# Altium footprint library SparkFun-Connectors.PCBLIB: 409 footprints (part 9 of 26)
Each footprint in its own frame and in the unit in brackets; x right, y up, seen from the top. Pads: shape width x height; smd on the part's side, far side on the other; paste and mask are expansions set on the pad; w line width, h text height; cw(c..) or ccw(c..) is an arc to the next point about the centre after c.
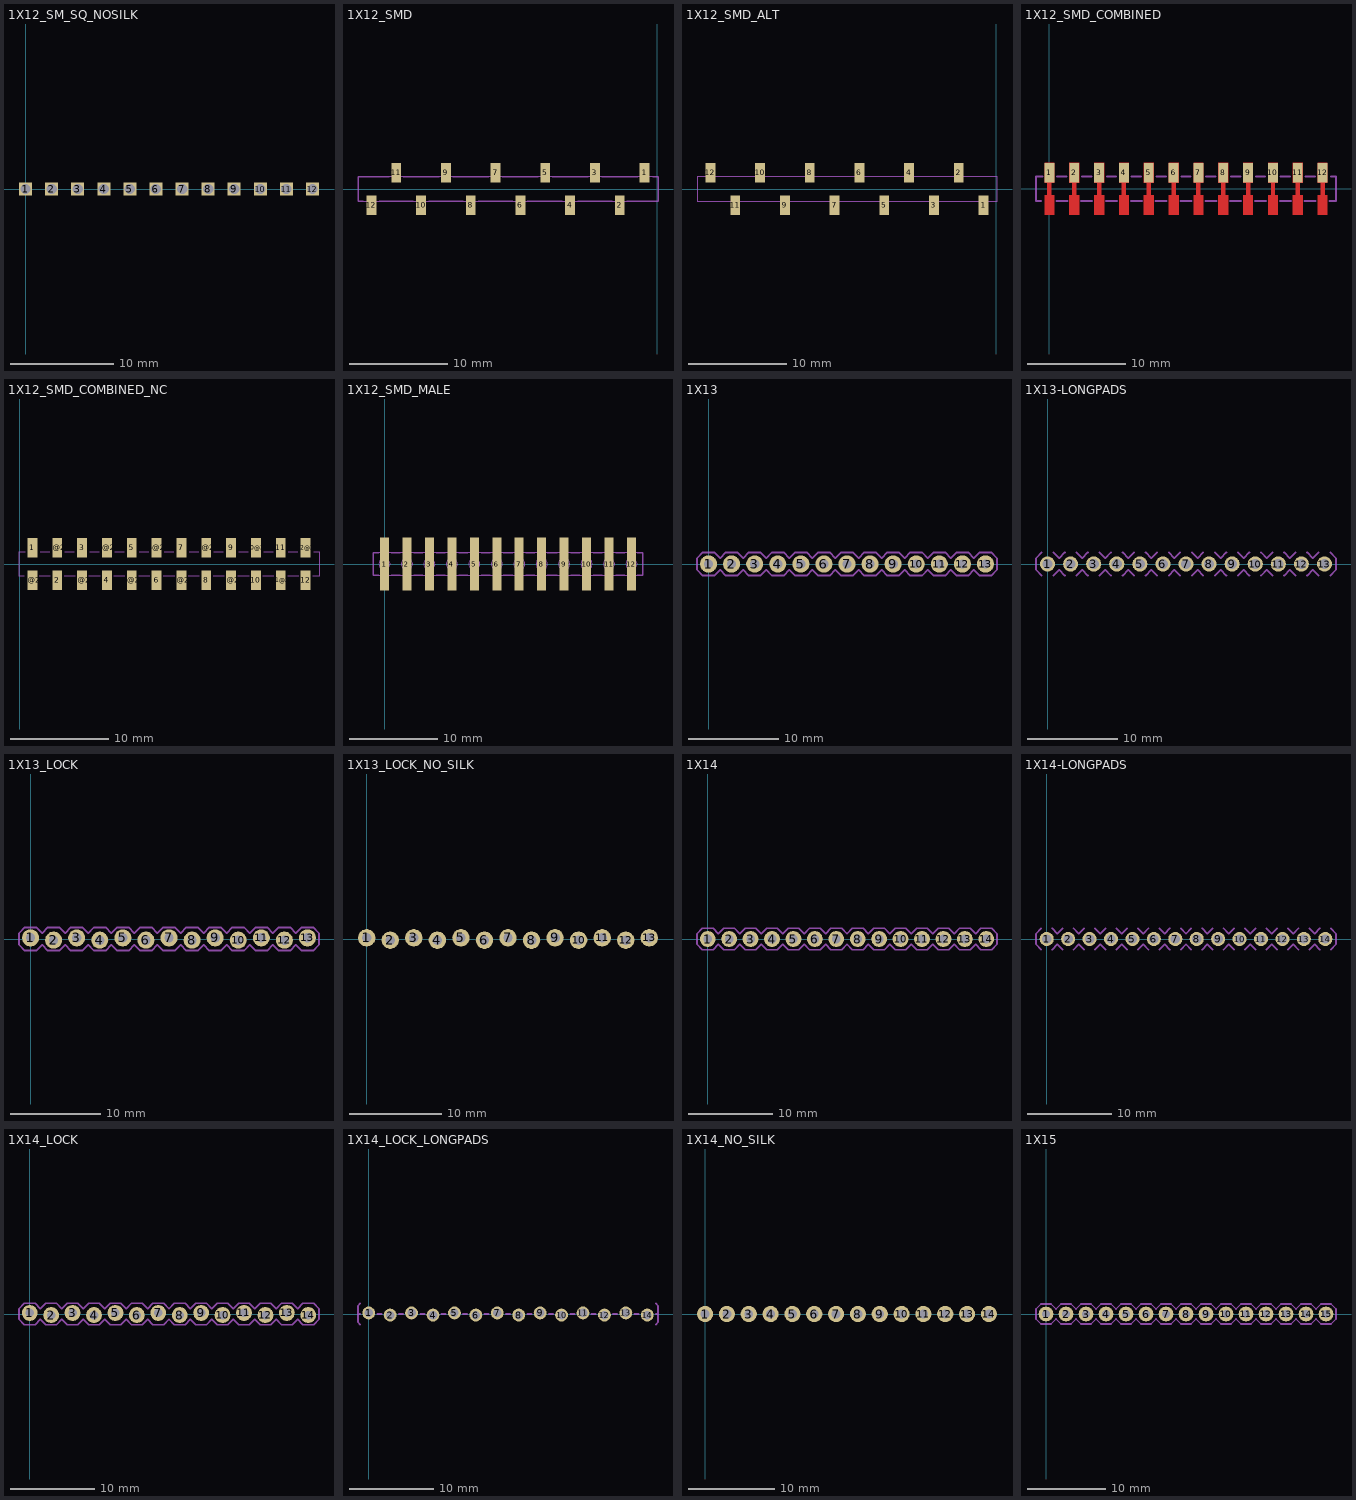
[diagram p8: the footprints below, top view; thin cyan lines are the x and y axes]

## 1X12_SM_SQ_NOSILK [mil]
pads (12):
  rect 50x50 / inner round 46.19 / far side rect 50x50 hole 40: 1(0,0) 2(100,0) 3(200,0) 4(300,0) 5(400,0) 6(500,0) 7(600,0) 8(700,0) 9(800,0) 10(900,0) 11(1000,0) 12(1100,0)

## 1X12_SMD [mm]
pads (12):
  rect 1x2 smd: 1(-1.27,1.65) 2(-3.81,-1.65) 3(-6.35,1.65) 4(-8.89,-1.65) 5(-11.43,1.65) 6(-13.97,-1.65) 7(-16.51,1.65) 8(-19.05,-1.65) 9(-21.59,1.65) 10(-24.13,-1.65) 11(-26.67,1.65) 12(-29.21,-1.65)
tDocu:
  lines w0.127: -20.42,-1.25 0.1,-1.25 0.1,1.25 -20.42,1.25 ; -10.06,-1.25 -30.58,-1.25 -30.58,1.25 -10.06,1.25
tPlace:
  lines w0.127: -30.06,-1.25 -30.58,-1.25 -30.58,1.25 -27.393,1.25 ; -28.421,-1.25 -24.919,-1.25 ; -25.967,1.25 -22.293,1.25 ; -23.341,-1.25 -19.839,-1.25 ; -20.887,1.25 -17.213,1.25 ; -18.261,-1.25 -14.759,-1.25 ; -15.807,1.25 -12.133,1.25 ; -13.247,-1.25 -10.06,-1.25 ; -13.181,-1.25 -9.679,-1.25 ; -10.727,1.25 -7.053,1.25 ; -10.58,1.25 -10.06,1.25 ; -8.101,-1.25 -4.599,-1.25 ; -5.647,1.25 -1.973,1.25 ; -3.087,-1.25 0.1,-1.25 0.1,1.25 -0.42,1.25

## 1X12_SMD_ALT [mm]
pads (12):
  rect 1x2 smd: 1(-1.27,-1.65) 2(-3.81,1.65) 3(-6.35,-1.65) 4(-8.89,1.65) 5(-11.43,-1.65) 6(-13.97,1.65) 7(-16.51,-1.65) 8(-19.05,1.65) 9(-21.59,-1.65) 10(-24.13,1.65) 11(-26.67,-1.65) 12(-29.21,1.65)
tDocu:
  lines w0.127: -20.42,-1.25 0.1,-1.25 0.1,1.25 -20.42,1.25 ; -10.06,-1.25 -30.58,-1.25 -30.58,1.25 -10.06,1.25
tPlace:
  lines w0.127: -30.06,1.25 -30.58,1.25 -30.58,-1.25 -27.393,-1.25 ; -28.507,1.25 -24.833,1.25 ; -25.881,-1.25 -22.379,-1.25 ; -23.427,1.25 -19.753,1.25 ; -20.801,-1.25 -17.299,-1.25 ; -18.347,1.25 -14.673,1.25 ; -15.721,-1.25 -12.219,-1.25 ; -13.267,1.25 -9.593,1.25 ; -13.247,1.25 -10.06,1.25 ; -10.641,-1.25 -7.139,-1.25 ; -10.58,-1.25 -10.06,-1.25 ; -8.187,1.25 -4.513,1.25 ; -5.561,-1.25 -2.059,-1.25 ; -3.087,1.25 0.1,1.25 0.1,-1.25 -0.42,-1.25

## 1X12_SMD_COMBINED [mm]
pads (12):
  rect 1x2 smd mask+0: 1(0,1.65) 2(2.54,1.65)
  rect 1x2 smd paste+0 mask+0: 3(5.08,1.65) 4(7.62,1.652) 5(10.16,1.65) 6(12.7,1.652) 7(15.24,1.65) 8(17.78,1.652) 9(20.32,1.65) 10(22.86,1.652) 11(25.4,1.65) 12(27.94,1.652)
Top:
  region: 2.04,2.65 3.04,2.65 3.04,0.65 2.74,0.65 2.74,-0.65 3.04,-0.65 3.04,-2.65 2.04,-2.65 2.04,-0.65 2.34,-0.65 2.34,0.65 2.04,0.65
  region: -0.5,2.65 0.5,2.65 0.5,0.65 0.2,0.65 0.2,-0.65 0.5,-0.65 0.5,-2.65 -0.5,-2.65 -0.5,-0.65 -0.2,-0.65 -0.2,0.65 -0.5,0.65
  region: 4.59,2.65 5.59,2.65 5.59,0.65 5.29,0.65 5.29,-0.65 5.59,-0.65 5.59,-2.65 4.59,-2.65 4.59,-0.65 4.89,-0.65 4.89,0.65 4.59,0.65
  region: 7.12,2.65 8.12,2.65 8.12,0.65 7.82,0.65 7.82,-0.65 8.12,-0.65 8.12,-2.65 7.12,-2.65 7.12,-0.65 7.42,-0.65 7.42,0.65 7.12,0.65
  region: 9.66,2.65 10.66,2.65 10.66,0.65 10.36,0.65 10.36,-0.65 10.66,-0.65 10.66,-2.65 9.66,-2.65 9.66,-0.65 9.96,-0.65 9.96,0.65 9.66,0.65
  region: 12.21,2.65 13.21,2.65 13.21,0.65 12.91,0.65 12.91,-0.65 13.21,-0.65 13.21,-2.65 12.21,-2.65 12.21,-0.65 12.51,-0.65 12.51,0.65 12.21,0.65
  region: 17.28,2.65 18.28,2.65 18.28,0.65 17.98,0.65 17.98,-0.65 18.28,-0.65 18.28,-2.65 17.28,-2.65 17.28,-0.65 17.58,-0.65 17.58,0.65 17.28,0.65
  region: 14.74,2.65 15.74,2.65 15.74,0.65 15.44,0.65 15.44,-0.65 15.74,-0.65 15.74,-2.65 14.74,-2.65 14.74,-0.65 15.04,-0.65 15.04,0.65 14.74,0.65
  region: 19.82,2.65 20.82,2.65 20.82,0.65 20.52,0.65 20.52,-0.65 20.82,-0.65 20.82,-2.65 19.82,-2.65 19.82,-0.65 20.12,-0.65 20.12,0.65 19.82,0.65
  region: 22.37,2.65 23.37,2.65 23.37,0.65 23.07,0.65 23.07,-0.65 23.37,-0.65 23.37,-2.65 22.37,-2.65 22.37,-0.65 22.67,-0.65 22.67,0.65 22.37,0.65
  region: 27.44,2.65 28.44,2.65 28.44,0.65 28.14,0.65 28.14,-0.65 28.44,-0.65 28.44,-2.65 27.44,-2.65 27.44,-0.65 27.74,-0.65 27.74,0.65 27.44,0.65
  region: 24.9,2.65 25.9,2.65 25.9,0.65 25.6,0.65 25.6,-0.65 25.9,-0.65 25.9,-2.65 24.9,-2.65 24.9,-0.65 25.2,-0.65 25.2,0.65 24.9,0.65
Top Paste:
  region: 3.12,-0.56 3.12,-2.76 1.92,-2.76 1.92,-0.56
  region: 3.14,2.74 3.14,0.54 1.94,0.54 1.94,2.74
  region: 0.58,-0.56 0.58,-2.76 -0.62,-2.76 -0.62,-0.56
  region: 0.6,2.74 0.6,0.54 -0.6,0.54 -0.6,2.74
  region: 5.67,-0.56 5.67,-2.76 4.47,-2.76 4.47,-0.56
  region: 5.69,2.74 5.69,0.54 4.49,0.54 4.49,2.74
  region: 8.2,-0.56 8.2,-2.76 7,-2.76 7,-0.56
  region: 8.22,2.74 8.22,0.54 7.02,0.54 7.02,2.74
  region: 10.74,-0.56 10.74,-2.76 9.54,-2.76 9.54,-0.56
  region: 10.76,2.74 10.76,0.54 9.56,0.54 9.56,2.74
  region: 13.29,-0.56 13.29,-2.76 12.09,-2.76 12.09,-0.56
  region: 13.31,2.74 13.31,0.54 12.11,0.54 12.11,2.74
  region: 18.36,-0.56 18.36,-2.76 17.16,-2.76 17.16,-0.56
  region: 18.38,2.74 18.38,0.54 17.18,0.54 17.18,2.74
  region: 15.82,-0.56 15.82,-2.76 14.62,-2.76 14.62,-0.56
  region: 15.84,2.74 15.84,0.54 14.64,0.54 14.64,2.74
  region: 20.9,-0.56 20.9,-2.76 19.7,-2.76 19.7,-0.56
  region: 20.92,2.74 20.92,0.54 19.72,0.54 19.72,2.74
  region: 23.45,-0.56 23.45,-2.76 22.25,-2.76 22.25,-0.56
  region: 23.47,2.74 23.47,0.54 22.27,0.54 22.27,2.74
  region: 28.52,-0.56 28.52,-2.76 27.32,-2.76 27.32,-0.56
  region: 28.54,2.74 28.54,0.54 27.34,0.54 27.34,2.74
  region: 25.98,-0.56 25.98,-2.76 24.78,-2.76 24.78,-0.56
  region: 26,2.74 26,0.54 24.8,0.54 24.8,2.74
Top Solder:
  region: 3.12,-0.56 3.12,-2.76 1.92,-2.76 1.92,-0.56
  region: 3.14,2.74 3.14,0.54 1.94,0.54 1.94,2.74
  region: 0.58,-0.56 0.58,-2.76 -0.62,-2.76 -0.62,-0.56
  region: 0.6,2.74 0.6,0.54 -0.6,0.54 -0.6,2.74
  region: 5.67,-0.56 5.67,-2.76 4.47,-2.76 4.47,-0.56
  region: 5.69,2.74 5.69,0.54 4.49,0.54 4.49,2.74
  region: 8.2,-0.56 8.2,-2.76 7,-2.76 7,-0.56
  region: 8.22,2.74 8.22,0.54 7.02,0.54 7.02,2.74
  region: 10.74,-0.56 10.74,-2.76 9.54,-2.76 9.54,-0.56
  region: 10.76,2.74 10.76,0.54 9.56,0.54 9.56,2.74
  region: 13.29,-0.56 13.29,-2.76 12.09,-2.76 12.09,-0.56
  region: 13.31,2.74 13.31,0.54 12.11,0.54 12.11,2.74
  region: 18.36,-0.56 18.36,-2.76 17.16,-2.76 17.16,-0.56
  region: 18.38,2.74 18.38,0.54 17.18,0.54 17.18,2.74
  region: 15.82,-0.56 15.82,-2.76 14.62,-2.76 14.62,-0.56
  region: 15.84,2.74 15.84,0.54 14.64,0.54 14.64,2.74
  region: 20.9,-0.56 20.9,-2.76 19.7,-2.76 19.7,-0.56
  region: 20.92,2.74 20.92,0.54 19.72,0.54 19.72,2.74
  region: 23.45,-0.56 23.45,-2.76 22.25,-2.76 22.25,-0.56
  region: 23.47,2.74 23.47,0.54 22.27,0.54 22.27,2.74
  region: 28.52,-0.56 28.52,-2.76 27.32,-2.76 27.32,-0.56
  region: 28.54,2.74 28.54,0.54 27.34,0.54 27.34,2.74
  region: 25.98,-0.56 25.98,-2.76 24.78,-2.76 24.78,-0.56
  region: 26,2.74 26,0.54 24.8,0.54 24.8,2.74
tPlace:
  lines w0.203: -0.85,-1.25 -1.37,-1.25 -1.37,1.25 -0.723,1.25 ; 0.703,-1.25 1.837,-1.25 ; 0.789,1.25 1.751,1.25 ; 3.243,-1.25 4.377,-1.25 ; 3.329,1.25 4.291,1.25 ; 5.783,-1.25 6.917,-1.25 ; 5.869,1.25 6.831,1.25 ; 8.323,-1.25 9.457,-1.25 ; 8.409,1.25 9.371,1.25 ; 10.863,-1.25 11.997,-1.25 ; 10.949,1.25 11.911,1.25 ; 13.403,-1.25 14.537,-1.25 ; 13.489,1.25 14.451,1.25 ; 15.943,-1.25 17.077,-1.25 ; 16.029,1.25 16.991,1.25 ; 18.483,-1.25 19.617,-1.25 ; 18.503,-1.25 19.15,-1.25 ; 18.569,1.25 19.531,1.25 ; 18.63,1.25 19.15,1.25 ; 21.023,-1.25 22.157,-1.25 ; 21.109,1.25 22.071,1.25 ; 23.563,-1.25 24.697,-1.25 ; 23.649,1.25 24.611,1.25 ; 26.103,-1.25 27.237,-1.25 ; 26.189,1.25 27.151,1.25 ; 28.663,-1.25 29.31,-1.25 29.31,1.25 28.79,1.25

## 1X12_SMD_COMBINED_NC [mm]
pads (24):
  rect 1x2 smd: 1(1.27,1.65) 1@2(1.27,-1.65) 2(3.81,-1.65) 2@2(3.81,1.65) 3(6.35,1.65) 3@2(6.35,-1.65) 4(8.89,-1.65) 4@2(8.89,1.65) 5(11.43,1.65) 5@2(11.43,-1.65) 6(13.97,-1.65) 6@2(13.97,1.65) 7(16.51,1.65) 7@2(16.51,-1.65) 8(19.05,-1.65) 8@2(19.05,1.65) 9(21.59,1.65) 9@2(21.59,-1.65) 10(24.13,-1.65) 10@2(24.13,1.65) 11(26.67,1.65) 11@2(26.67,-1.65) 12(29.21,-1.65) 12@2(29.21,1.65)
tPlace:
  lines w0.127: 0.42,-1.25 -0.1,-1.25 -0.1,1.25 0.547,1.25 ; 1.973,-1.25 3.107,-1.25 ; 2.059,1.25 3.021,1.25 ; 4.513,-1.25 5.647,-1.25 ; 4.599,1.25 5.561,1.25 ; 7.053,-1.25 8.187,-1.25 ; 7.139,1.25 8.101,1.25 ; 9.593,-1.25 10.727,-1.25 ; 9.679,1.25 10.641,1.25 ; 12.133,-1.25 13.267,-1.25 ; 12.219,1.25 13.181,1.25 ; 14.673,-1.25 15.807,-1.25 ; 14.759,1.25 15.721,1.25 ; 17.213,-1.25 18.347,-1.25 ; 17.299,1.25 18.261,1.25 ; 19.753,-1.25 20.887,-1.25 ; 19.773,-1.25 20.42,-1.25 ; 19.839,1.25 20.801,1.25 ; 19.9,1.25 20.42,1.25 ; 22.293,-1.25 23.427,-1.25 ; 22.379,1.25 23.341,1.25 ; 24.833,-1.25 25.967,-1.25 ; 24.919,1.25 25.881,1.25 ; 27.373,-1.25 28.507,-1.25 ; 27.459,1.25 28.421,1.25 ; 29.933,-1.25 30.58,-1.25 30.58,1.25 30.06,1.25

## 1X12_SMD_MALE [mm]
pads (12):
  rect 1.02x6 smd: 1(0,0) 2(2.54,0) 3(5.08,0) 4(7.62,0) 5(10.16,0) 6(12.7,0) 7(15.24,0) 8(17.78,0) 9(20.32,0) 10(22.86,0) 11(25.4,0) 12(27.94,0)
tDocu:
  circle w0.127: c0,0 r0.64
  circle w0.127: c2.54,0 r0.64
  circle w0.127: c5.08,0 r0.64
  circle w0.127: c7.62,0 r0.64
  circle w0.127: c10.16,0 r0.64
  circle w0.127: c12.7,0 r0.64
  circle w0.127: c15.24,0 r0.64
  circle w0.127: c17.78,0 r0.64
  circle w0.127: c20.32,0 r0.64
  circle w0.127: c22.86,0 r0.64
  circle w0.127: c25.4,0 r0.64
  circle w0.127: c27.94,0 r0.64
  region: -0.32,0 -0.32,2.75 0.32,2.75 0.32,0
  region: 4.76,0 4.76,2.75 5.4,2.75 5.4,0
  region: 9.84,0 9.84,2.75 10.48,2.75 10.48,0
  region: 2.86,0 2.86,-2.75 2.22,-2.75 2.22,0
  region: 7.94,0 7.94,-2.75 7.3,-2.75 7.3,0
  region: 13.02,0 13.02,-2.75 12.38,-2.75 12.38,0
  region: 14.92,0 14.92,2.75 15.56,2.75 15.56,0
  region: 18.1,0 18.1,-2.75 17.46,-2.75 17.46,0
  region: 20,0 20,2.75 20.64,2.75 20.64,0
  region: 23.18,0 23.18,-2.75 22.54,-2.75 22.54,0
  region: 25.08,0 25.08,2.75 25.72,2.75 25.72,0
  region: 28.26,0 28.26,-2.75 27.62,-2.75 27.62,0
  lines w0.127: 8.89,-1.25 29.21,-1.25 29.21,1.25 8.89,1.25 ; 19.05,-1.25 -1.27,-1.25 -1.27,1.25 19.05,1.25
tPlace:
  lines w0.178: -0.635,-1.25 -1.27,-1.25 -1.27,1.25 -0.635,1.25 ; 0.762,-1.25 1.778,-1.25 ; 0.762,1.25 1.778,1.25 ; 3.302,-1.25 4.318,-1.25 ; 3.302,1.25 4.318,1.25 ; 5.842,-1.25 6.858,-1.25 ; 5.842,1.25 6.858,1.25 ; 8.382,-1.25 9.398,-1.25 ; 8.382,1.25 9.398,1.25 ; 10.922,-1.25 11.938,-1.25 ; 10.922,1.25 11.938,1.25 ; 13.462,-1.25 14.478,-1.25 ; 13.462,1.25 14.478,1.25 ; 16.002,-1.25 17.018,-1.25 ; 16.002,1.25 17.018,1.25 ; 18.415,-1.25 19.05,-1.25 ; 18.415,1.25 19.05,1.25 ; 18.542,-1.25 19.558,-1.25 ; 18.542,1.25 19.558,1.25 ; 21.082,-1.25 22.098,-1.25 ; 21.082,1.25 22.098,1.25 ; 23.622,-1.25 24.638,-1.25 ; 23.622,1.25 24.638,1.25 ; 26.162,-1.25 27.178,-1.25 ; 26.162,1.25 27.178,1.25 ; 28.575,-1.25 29.21,-1.25 29.21,1.25 28.575,1.25

## 1X13 [mil]
pads (13):
  round 74 hole 40: 1(0,0) 2(100,0) 3(200,0) 4(300,0) 5(400,0) 6(500,0) 7(600,0) 8(700,0) 9(800,0) 10(900,0) 11(1000,0) 12(1100,0) 13(1200,0)
tDocu:
  region: 590,-10 590,10 610,10 610,-10
  region: 490,-10 490,10 510,10 510,-10
  region: 390,-10 390,10 410,10 410,-10
  region: 290,-10 290,10 310,10 310,-10
  region: 190,-10 190,10 210,10 210,-10
  region: 90,-10 90,10 110,10 110,-10
  region: -10,-10 -10,10 10,10 10,-10
  region: 1190,-10 1190,10 1210,10 1210,-10
  region: 1090,-10 1090,10 1110,10 1110,-10
  region: 990,-10 990,10 1010,10 1010,-10
  region: 890,-10 890,10 910,10 910,-10
  region: 790,-10 790,10 810,10 810,-10
  region: 690,-10 690,10 710,10 710,-10
tPlace:
  lines w8: -50,-25 -50,25 -25,50 25,50 50,25 75,50 125,50 150,25 175,50 225,50 250,25 275,50 325,50 350,25 375,50 425,50 450,25 475,50 525,50 550,25 575,50 625,50 650,25 675,50 725,50 750,25 775,50 825,50 850,25 875,50 925,50 950,25 975,50 1025,50 1050,25 1075,50 1125,50 1150,25 1175,50 1225,50 1250,25 1250,-25 1225,-50 1175,-50 1150,-25 1125,-50 1075,-50 1050,-25 1025,-50 975,-50 950,-25 925,-50 875,-50 850,-25 825,-50 775,-50 750,-25 725,-50 675,-50 650,-25 625,-50 575,-50 550,-25 525,-50 475,-50 450,-25 425,-50 375,-50 350,-25 325,-50 275,-50 250,-25 225,-50 175,-50 150,-25 125,-50 75,-50 50,-25 25,-50 -25,-50 -50,-25

## 1X13-LONGPADS [mil]
pads (13):
  round 66 hole 44: 1(0,0) 2(100,0) 3(200,0) 4(300,0) 5(400,0) 6(500,0) 7(600,0) 8(700,0) 9(800,0) 10(900,0) 11(1000,0) 12(1100,0) 13(1200,0)
tDocu:
  region: 590,-10 590,10 610,10 610,-10
  region: 490,-10 490,10 510,10 510,-10
  region: 390,-10 390,10 410,10 410,-10
  region: 290,-10 290,10 310,10 310,-10
  region: 190,-10 190,10 210,10 210,-10
  region: 90,-10 90,10 110,10 110,-10
  region: -10,-10 -10,10 10,10 10,-10
  region: 1190,-10 1190,10 1210,10 1210,-10
  region: 1090,-10 1090,10 1110,10 1110,-10
  region: 990,-10 990,10 1010,10 1010,-10
  region: 890,-10 890,10 910,10 910,-10
  region: 790,-10 790,10 810,10 810,-10
  region: 690,-10 690,10 710,10 710,-10
tPlace:
  lines w8: -25,-50 -50,-25 -50,25 -25,50 ; 25,-50 50,-25 75,-50 ; 25,50 50,25 75,50 ; 125,-50 150,-25 175,-50 ; 125,50 150,25 175,50 ; 225,-50 250,-25 275,-50 ; 225,50 250,25 275,50 ; 325,-50 350,-25 375,-50 ; 325,50 350,25 375,50 ; 425,-50 450,-25 475,-50 ; 425,50 450,25 475,50 ; 525,-50 550,-25 575,-50 ; 525,50 550,25 575,50 ; 625,-50 650,-25 675,-50 ; 625,50 650,25 675,50 ; 725,-50 750,-25 775,-50 ; 725,50 750,25 775,50 ; 825,-50 850,-25 875,-50 ; 825,50 850,25 875,50 ; 925,-50 950,-25 975,-50 ; 925,50 950,25 975,50 ; 1025,-50 1050,-25 1075,-50 ; 1025,50 1050,25 1075,50 ; 1125,-50 1150,-25 1175,-50 ; 1125,50 1150,25 1175,50 ; 1225,-50 1250,-25 1250,25 1225,50

## 1X13_LOCK [mil]
pads (13):
  round 74 hole 40: 1(0,5) 2(100,-5) 3(200,5) 4(300,-5) 5(400,5) 6(500,-5) 7(600,5) 8(700,-5) 9(800,5) 10(900,-5) 11(1000,5) 12(1100,-5) 13(1200,5)
tDocu:
  region: 590,-10 590,10 610,10 610,-10
  region: 510,-10 490,-10 490,10 510,10
  region: 390,-10 390,10 410,10 410,-10
  region: 290,-10 290,10 310,10 310,-10
  region: 190,-10 190,10 210,10 210,-10
  region: 90,-10 90,10 110,10 110,-10
  region: -10,-10 -10,10 10,10 10,-10
  region: 690,-10 690,10 710,10 710,-10
  region: 790,-10 790,10 810,10 810,-10
  region: 890,-10 890,10 910,10 910,-10
  region: 990,-10 990,10 1010,10 1010,-10
  region: 1090,-10 1090,10 1110,10 1110,-10
  region: 1190,-10 1190,10 1210,10 1210,-10
tPlace:
  lines w8: -50,-25 -50,25 -25,50 25,50 50,25 75,50 125,50 150,25 175,50 225,50 250,25 275,50 325,50 350,25 375,50 425,50 450,25 475,50 525,50 550,25 575,50 625,50 650,25 675,50 725,50 750,25 775,50 825,50 850,25 875,50 925,50 950,25 975,50 1025,50 1050,25 1075,50 1125,50 1150,25 1175,50 1225,50 1250,25 1250,-25 1225,-50 1175,-50 1150,-25 1125,-50 1075,-50 1050,-25 1025,-50 975,-50 950,-25 925,-50 875,-50 850,-25 825,-50 775,-50 750,-25 725,-50 675,-50 650,-25 625,-50 575,-50 550,-25 525,-50 475,-50 450,-25 425,-50 375,-50 350,-25 325,-50 275,-50 250,-25 225,-50 175,-50 150,-25 125,-50 75,-50 50,-25 25,-50 -25,-50 -50,-25

## 1X13_LOCK_NO_SILK [mil]
pads (13):
  round 74 hole 40: 1(0,5) 2(100,-5) 3(200,5) 4(300,-5) 5(400,5) 6(500,-5) 7(600,5) 8(700,-5) 9(800,5) 10(900,-5) 11(1000,5) 12(1100,-5) 13(1200,5)
tDocu:
  region: 590,-10 590,10 610,10 610,-10
  region: 510,-10 490,-10 490,10 510,10
  region: 390,-10 390,10 410,10 410,-10
  region: 290,-10 290,10 310,10 310,-10
  region: 190,-10 190,10 210,10 210,-10
  region: 90,-10 90,10 110,10 110,-10
  region: -10,-10 -10,10 10,10 10,-10
  region: 690,-10 690,10 710,10 710,-10
  region: 790,-10 790,10 810,10 810,-10
  region: 890,-10 890,10 910,10 910,-10
  region: 990,-10 990,10 1010,10 1010,-10
  region: 1090,-10 1090,10 1110,10 1110,-10
  region: 1190,-10 1190,10 1210,10 1210,-10

## 1X14 [mil]
pads (14):
  round 74 hole 40: 1(0,0) 2(100,0) 3(200,0) 4(300,0) 5(400,0) 6(500,0) 7(600,0) 8(700,0) 9(800,0) 10(900,0) 11(1000,0) 12(1100,0) 13(1200,0) 14(1300,0)
tDocu:
  region: 590,-10 590,10 610,10 610,-10
  region: 490,-10 490,10 510,10 510,-10
  region: 390,-10 390,10 410,10 410,-10
  region: 290,-10 290,10 310,10 310,-10
  region: 190,-10 190,10 210,10 210,-10
  region: 90,-10 90,10 110,10 110,-10
  region: -10,-10 -10,10 10,10 10,-10
  region: 1290,-10 1290,10 1310,10 1310,-10
  region: 1190,-10 1190,10 1210,10 1210,-10
  region: 1090,-10 1090,10 1110,10 1110,-10
  region: 990,-10 990,10 1010,10 1010,-10
  region: 890,-10 890,10 910,10 910,-10
  region: 790,-10 790,10 810,10 810,-10
  region: 690,-10 690,10 710,10 710,-10
tPlace:
  lines w8: -50,-25 -50,25 -25,50 25,50 50,25 75,50 125,50 150,25 175,50 225,50 250,25 275,50 325,50 350,25 375,50 425,50 450,25 475,50 525,50 550,25 575,50 625,50 650,25 675,50 725,50 750,25 775,50 825,50 850,25 875,50 925,50 950,25 975,50 1025,50 1050,25 1075,50 1125,50 1150,25 1175,50 1225,50 1250,25 1275,50 1325,50 1350,25 1350,-25 1325,-50 1275,-50 1250,-25 1225,-50 1175,-50 1150,-25 1125,-50 1075,-50 1050,-25 1025,-50 975,-50 950,-25 925,-50 875,-50 850,-25 825,-50 775,-50 750,-25 725,-50 675,-50 650,-25 625,-50 575,-50 550,-25 525,-50 475,-50 450,-25 425,-50 375,-50 350,-25 325,-50 275,-50 250,-25 225,-50 175,-50 150,-25 125,-50 75,-50 50,-25 25,-50 -25,-50 -50,-25

## 1X14-LONGPADS [mil]
pads (14):
  round 66 hole 44: 1(0,0) 2(100,0) 3(200,0) 4(300,0) 5(400,0) 6(500,0) 7(600,0) 8(700,0) 9(800,0) 10(900,0) 11(1000,0) 12(1100,0) 13(1200,0) 14(1300,0)
tDocu:
  region: 590,-10 590,10 610,10 610,-10
  region: 490,-10 490,10 510,10 510,-10
  region: 390,-10 390,10 410,10 410,-10
  region: 290,-10 290,10 310,10 310,-10
  region: 190,-10 190,10 210,10 210,-10
  region: 90,-10 90,10 110,10 110,-10
  region: -10,-10 -10,10 10,10 10,-10
  region: 1290,-10 1290,10 1310,10 1310,-10
  region: 1190,-10 1190,10 1210,10 1210,-10
  region: 1090,-10 1090,10 1110,10 1110,-10
  region: 990,-10 990,10 1010,10 1010,-10
  region: 890,-10 890,10 910,10 910,-10
  region: 790,-10 790,10 810,10 810,-10
  region: 690,-10 690,10 710,10 710,-10
tPlace:
  lines w8: -25,-50 -50,-25 -50,25 -25,50 ; 25,-50 50,-25 75,-50 ; 25,50 50,25 75,50 ; 125,-50 150,-25 175,-50 ; 125,50 150,25 175,50 ; 225,-50 250,-25 275,-50 ; 225,50 250,25 275,50 ; 325,-50 350,-25 375,-50 ; 325,50 350,25 375,50 ; 425,-50 450,-25 475,-50 ; 425,50 450,25 475,50 ; 525,-50 550,-25 575,-50 ; 525,50 550,25 575,50 ; 625,-50 650,-25 675,-50 ; 625,50 650,25 675,50 ; 725,-50 750,-25 775,-50 ; 725,50 750,25 775,50 ; 825,-50 850,-25 875,-50 ; 825,50 850,25 875,50 ; 925,-50 950,-25 975,-50 ; 925,50 950,25 975,50 ; 1025,-50 1050,-25 1075,-50 ; 1025,50 1050,25 1075,50 ; 1125,-50 1150,-25 1175,-50 ; 1125,50 1150,25 1175,50 ; 1225,-50 1250,-25 1275,-50 ; 1225,50 1250,25 1275,50 ; 1325,-50 1350,-25 1350,25 1325,50

## 1X14_LOCK [mil]
pads (14):
  round 74 hole 40: 1(0,5) 2(100,-5) 3(200,5) 4(300,-5) 5(400,5) 6(500,-5) 7(600,5) 8(700,-5) 9(800,5) 10(900,-5) 11(1000,5) 12(1100,-5) 13(1200,5) 14(1300,-5)
tDocu:
  region: 590,-10 590,10 610,10 610,-10
  region: 490,-10 490,10 510,10 510,-10
  region: 390,-10 390,10 410,10 410,-10
  region: 290,-10 290,10 310,10 310,-10
  region: 190,-10 190,10 210,10 210,-10
  region: 90,-10 90,10 110,10 110,-10
  region: -10,-10 -10,10 10,10 10,-10
  region: 1290,-10 1290,10 1310,10 1310,-10
  region: 1190,-10 1190,10 1210,10 1210,-10
  region: 1090,-10 1090,10 1110,10 1110,-10
  region: 990,-10 990,10 1010,10 1010,-10
  region: 890,-10 890,10 910,10 910,-10
  region: 790,-10 790,10 810,10 810,-10
  region: 690,-10 690,10 710,10 710,-10
tPlace:
  lines w8: -50,-25 -50,25 -25,50 25,50 50,25 75,50 125,50 150,25 175,50 225,50 250,25 275,50 325,50 350,25 375,50 425,50 450,25 475,50 525,50 550,25 575,50 625,50 650,25 675,50 725,50 750,25 775,50 825,50 850,25 875,50 925,50 950,25 975,50 1025,50 1050,25 1075,50 1125,50 1150,25 1175,50 1225,50 1250,25 1275,50 1325,50 1350,25 1350,-25 1325,-50 1275,-50 1250,-25 1225,-50 1175,-50 1150,-25 1125,-50 1075,-50 1050,-25 1025,-50 975,-50 950,-25 925,-50 875,-50 850,-25 825,-50 775,-50 750,-25 725,-50 675,-50 650,-25 625,-50 575,-50 550,-25 525,-50 475,-50 450,-25 425,-50 375,-50 350,-25 325,-50 275,-50 250,-25 225,-50 175,-50 150,-25 125,-50 75,-50 50,-25 25,-50 -25,-50 -50,-25

## 1X14_LOCK_LONGPADS [mil]
pads (14):
  round 60 hole 40: 1(0,5) 2(100,-5) 3(200,5) 4(300,-5) 5(400,5) 6(500,-5) 7(600,5) 8(700,-5) 9(800,5) 10(900,-5) 11(1000,5) 12(1100,-5) 13(1200,5) 14(1300,-5)
tDocu:
  region: -11.5,-11.5 -11.5,11.5 11.5,11.5 11.5,-11.5
  region: 88.5,-11.5 88.5,11.5 111.5,11.5 111.5,-11.5
  region: 188.5,-11.5 188.5,11.5 211.5,11.5 211.5,-11.5
  region: 311.5,-11.5 288.5,-11.5 288.5,11.5 311.5,11.5
  region: 388.5,-11.5 388.5,11.5 411.5,11.5 411.5,-11.5
  region: 488.5,-11.5 488.5,11.5 511.5,11.5 511.5,-11.5
  region: 588.5,-11.5 588.5,11.5 611.5,11.5 611.5,-11.5
  region: 688.5,-11.5 688.5,11.5 711.5,11.5 711.5,-11.5
  region: 788.5,-11.5 788.5,11.5 811.5,11.5 811.5,-11.5
  region: 911.5,-11.5 888.5,-11.5 888.5,11.5 911.5,11.5
  region: 988.5,-11.5 988.5,11.5 1011.5,11.5 1011.5,-11.5
  region: 1088.5,-11.5 1088.5,11.5 1111.5,11.5 1111.5,-11.5
  region: 1188.5,-11.5 1188.5,11.5 1211.5,11.5 1211.5,-11.5
  region: 1288.5,-11.5 1288.5,11.5 1311.5,11.5 1311.5,-11.5
tPlace:
  lines w8: -40,0 -50,0 ; -39,-50 -50,-39 -50,0 ; -39,50 -50,39 -50,0 ; 40,0 60,0 ; 140,0 160,0 ; 240,0 260,0 ; 340,0 360,0 ; 440,0 460,0 ; 540,0 560,0 ; 640,0 660,0 ; 740,0 760,0 ; 840,0 860,0 ; 940,0 960,0 ; 1040,0 1060,0 ; 1140,0 1160,0 ; 1240,0 1260,0 ; 1339,-50 1350,-39 1350,0 ; 1339,50 1350,39 1350,0 ; 1340,0 1350,0

## 1X14_NO_SILK [mil]
pads (14):
  round 74 hole 40: 1(0,0) 2(100,0) 3(200,0) 4(300,0) 5(400,0) 6(500,0) 7(600,0) 8(700,0) 9(800,0) 10(900,0) 11(1000,0) 12(1100,0) 13(1200,0) 14(1300,0)
tDocu:
  region: 590,-10 590,10 610,10 610,-10
  region: 490,-10 490,10 510,10 510,-10
  region: 390,-10 390,10 410,10 410,-10
  region: 290,-10 290,10 310,10 310,-10
  region: 190,-10 190,10 210,10 210,-10
  region: 90,-10 90,10 110,10 110,-10
  region: -10,-10 -10,10 10,10 10,-10
  region: 1290,-10 1290,10 1310,10 1310,-10
  region: 1190,-10 1190,10 1210,10 1210,-10
  region: 1090,-10 1090,10 1110,10 1110,-10
  region: 990,-10 990,10 1010,10 1010,-10
  region: 890,-10 890,10 910,10 910,-10
  region: 790,-10 790,10 810,10 810,-10
  region: 690,-10 690,10 710,10 710,-10

## 1X15 [mil]
pads (15):
  round 74 hole 40: 1(0,0) 2(100,0) 3(200,0) 4(300,0) 5(400,0) 6(500,0) 7(600,0) 8(700,0) 9(800,0) 10(900,0) 11(1000,0) 12(1100,0) 13(1200,0) 14(1300,0) 15(1400,0)
tDocu:
  region: 590,-10 590,10 610,10 610,-10
  region: 490,-10 490,10 510,10 510,-10
  region: 390,-10 390,10 410,10 410,-10
  region: 290,-10 290,10 310,10 310,-10
  region: 190,-10 190,10 210,10 210,-10
  region: 90,-10 90,10 110,10 110,-10
  region: -10,-10 -10,10 10,10 10,-10
  region: 1290,-10 1290,10 1310,10 1310,-10
  region: 1190,-10 1190,10 1210,10 1210,-10
  region: 1090,-10 1090,10 1110,10 1110,-10
  region: 990,-10 990,10 1010,10 1010,-10
  region: 890,-10 890,10 910,10 910,-10
  region: 790,-10 790,10 810,10 810,-10
  region: 690,-10 690,10 710,10 710,-10
  region: 1390,-10 1390,10 1410,10 1410,-10
tPlace:
  lines w8: -50,-25 -50,25 -25,50 25,50 50,25 75,50 125,50 150,25 175,50 225,50 250,25 275,50 325,50 350,25 375,50 425,50 450,25 475,50 525,50 550,25 575,50 625,50 650,25 675,50 725,50 750,25 775,50 825,50 850,25 875,50 925,50 950,25 975,50 1025,50 1050,25 1075,50 1125,50 1150,25 1175,50 1225,50 1250,25 1275,50 1325,50 1350,25 1375,50 1425,50 1450,25 1450,-25 1425,-50 1375,-50 1350,-25 1325,-50 1275,-50 1250,-25 1225,-50 1175,-50 1150,-25 1125,-50 1075,-50 1050,-25 1025,-50 975,-50 950,-25 925,-50 875,-50 850,-25 825,-50 775,-50 750,-25 725,-50 675,-50 650,-25 625,-50 575,-50 550,-25 525,-50 475,-50 450,-25 425,-50 375,-50 350,-25 325,-50 275,-50 250,-25 225,-50 175,-50 150,-25 125,-50 75,-50 50,-25 25,-50 -25,-50 -50,-25